# Altium footprint library nodemcu_esp_32s.PcbLib: 1 footprints
Each footprint in its own frame and in the unit in brackets; x right, y up, seen from the top. Pads: shape width x height; smd on the part's side, far side on the other; paste and mask are expansions set on the pad; w line width, h text height; cw(c..) or ccw(c..) is an arc to the next point about the centre after c.
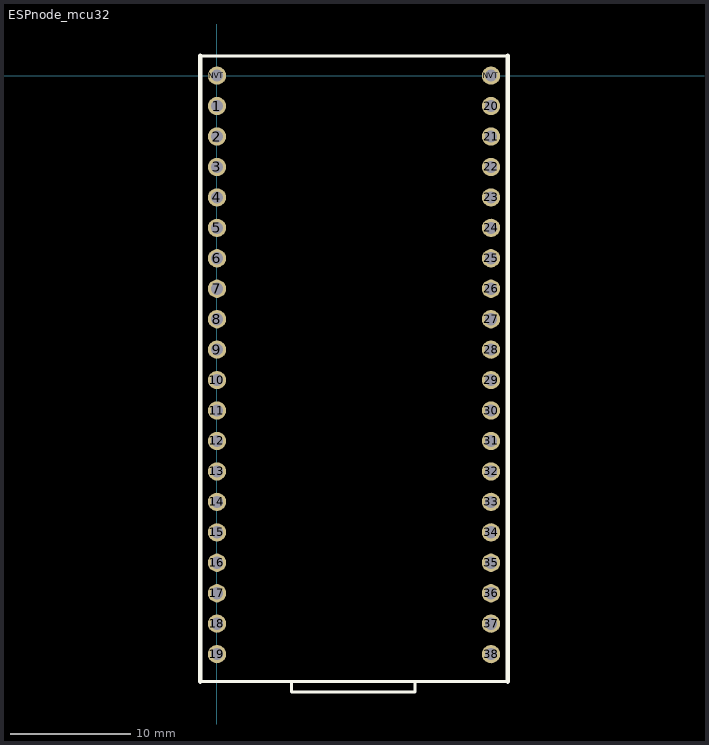
[diagram p0: the footprint, top view; thin cyan lines are the x and y axes]

## ESPnode_mcu32 [mil]
pads (40):
  round 60 hole 40: 1(0,-100) 2(0,-200) 3(0,-300) 4(0,-400) 5(0,-500) 6(0,-600) 7(0,-700) 8(0,-800) 9(0,-900) 10(0,-1000) 11(0,-1100) 12(0,-1200) 13(0,-1300) 14(0,-1400) 15(0,-1500) 16(0,-1600) 17(0,-1700) 18(0,-1800) 19(0,-1900) 20(900,-100) 21(900,-200) 22(900,-300) 23(900,-400) 24(900,-500) 25(900,-600) 26(900,-700) 27(900,-800) 28(900,-900) 29(900,-1000) 30(900,-1100) 31(900,-1200) 32(900,-1300) 33(900,-1400) 34(900,-1500) 35(900,-1600) 36(900,-1700) 37(900,-1800) 38(900,-1900) NVT(0,0) NVT(900,0)
Top Overlay:
  lines w10: -55,-1990 955,-1990 ; -55,65 955,65 ; 245,-1990 245,-2025 450,-2025 650,-2025 650,-1995 655,-1990
  lines w15: -55,-1990 -55,65 ; 955,-1990 955,65
3D body "ESP32S Dev Board 0.9inch width ASSY.SLDPRT": height 681.1, standoff 163.78, extent -60,-1985.49 960,-44
3D body: height 10, standoff -1622.44, extent 2730,300 2730,300
3D body: height 10, standoff -1622.44, extent 2330,140 2330,140
3D body: height 50, standoff 0, extent 765,-1085 765,-1085
3D body: height 50, standoff 0, extent 1415,-1280 1415,-1280
3D body: height 10, standoff 0, extent 270,-625 270,-625
3D body: height 10, standoff 0, extent 1335,-2275 1335,-2275
3D body: height 10, standoff 0, extent 435,-815 435,-815
3D body "zl262-10s_p2-54_l25-9_w2-5_h8-5.stp": height 334.65, standoff -118.11, extent 850,-959.69 950,60
3D body "zl262-10s_p2-54_l25-9_w2-5_h8-5.stp": height 334.65, standoff -118.11, extent -40,-969.69 60,50
3D body "zl262-10s_p2-54_l25-9_w2-5_h8-5.stp": height 334.65, standoff -118.11, extent -45,-1965 55,-945.31
3D body "zl262-10s_p2-54_l25-9_w2-5_h8-5.stp": height 334.65, standoff -118.11, extent 850,-1959.69 950,-940